# Altium integrated library Weidmueller_OMNIMATE_Signal.IntLib: 2550 symbols (part 38 of 45) (continued)
## 1886180000_Single (continued)
OMNIMATE Signal - series LSF; PartNumber: 1886180000; Manufacturer: Weidmueller; Short_text_for_material: LSF-SMT 7.62/02/135 3.5SN BK TU; Side_termination_characteristic: closed side; Mounting_onto_the_PCB: Reflow solder connection; Pitch_mm: 7,62 mm; Pitch_inch: 0,3 inch; No_of_poles: 2; Solder_pin_length_mm: 3,5 mm; Contact_material: Cu-Leg; Contact_surface: tinned; Insulating_material: LCP GF; UL_94_flammability_rating: V-0; Rated_voltage_for_surge_voltage_class_pollution_degree_II_2: 800 V; Rated_current_min_no_of_poles_TU_20_deg_C: 17,5 A; Solid_min_H05_07_V_U: 0,2 mm²; Solid_max_H05_07_V_U: 1,5 mm²; Rated_voltage_use_group_B_UL_1059: 300 V; Rated_current_use_group_B_UL_1059: 12 A; Wire_cross_section_AWG_min_UL_1059: AWG 24; Wire_cross_section_AWG_max_UL_1059: AWG 16; PackageReference: LSF_SMT_7_62_135_02; Colour: Black; Packaging: Tube; Qty: 46 PCS; Revision: V1; ComponentLink1Description: Manufacturer URL; ComponentLink1URL: http://www.weidmueller.com/; ComponentLink2Description: URL Link1; ComponentLink2URL: http://catalog.weidmueller.com/catalog/Start.do?localeId=en&ObjectID=1886180000
footprint LSF_SMT_7_62_135_02 (OMNIMATE Signal - Serie LSF  LSF-SMT 7.62/02/135 1.5)
part A pins: A1
part B pins: A2
1 alternate drawing of the same symbol

## 1886190000
designator E?
OMNIMATE Signal - series LSF; PartNumber: 1886190000; Manufacturer: Weidmueller; Short_text_for_material: LSF-SMT 7.62/03/135 3.5SN BK TU; Side_termination_characteristic: closed side; Mounting_onto_the_PCB: Reflow solder connection; Pitch_mm: 7,62 mm; Pitch_inch: 0,3 inch; No_of_poles: 3; Solder_pin_length_mm: 3,5 mm; Contact_material: Cu-Leg; Contact_surface: tinned; Insulating_material: LCP GF; UL_94_flammability_rating: V-0; Rated_voltage_for_surge_voltage_class_pollution_degree_II_2: 800 V; Rated_current_min_no_of_poles_TU_20_deg_C: 17,5 A; Solid_min_H05_07_V_U: 0,2 mm²; Solid_max_H05_07_V_U: 1,5 mm²; Rated_voltage_use_group_B_UL_1059: 300 V; Rated_current_use_group_B_UL_1059: 12 A; Wire_cross_section_AWG_min_UL_1059: AWG 24; Wire_cross_section_AWG_max_UL_1059: AWG 16; PackageReference: LSF_SMT_7_62_135_03; Colour: Black; Packaging: Tube; Qty: 28 PCS; Revision: V1; ComponentLink1Description: Manufacturer URL; ComponentLink1URL: http://www.weidmueller.com/; ComponentLink2Description: URL Link1; ComponentLink2URL: http://catalog.weidmueller.com/catalog/Start.do?localeId=en&ObjectID=1886190000
footprint LSF_SMT_7_62_135_03 (OMNIMATE Signal - Serie LSF  LSF-SMT 7.62/03/135 1.5)
pins: A1, A2, A3
1 alternate drawing of the same symbol

## 1886190000_Single
designator E?
OMNIMATE Signal - series LSF; PartNumber: 1886190000; Manufacturer: Weidmueller; Short_text_for_material: LSF-SMT 7.62/03/135 3.5SN BK TU; Side_termination_characteristic: closed side; Mounting_onto_the_PCB: Reflow solder connection; Pitch_mm: 7,62 mm; Pitch_inch: 0,3 inch; No_of_poles: 3; Solder_pin_length_mm: 3,5 mm; Contact_material: Cu-Leg; Contact_surface: tinned; Insulating_material: LCP GF; UL_94_flammability_rating: V-0; Rated_voltage_for_surge_voltage_class_pollution_degree_II_2: 800 V; Rated_current_min_no_of_poles_TU_20_deg_C: 17,5 A; Solid_min_H05_07_V_U: 0,2 mm²; Solid_max_H05_07_V_U: 1,5 mm²; Rated_voltage_use_group_B_UL_1059: 300 V; Rated_current_use_group_B_UL_1059: 12 A; Wire_cross_section_AWG_min_UL_1059: AWG 24; Wire_cross_section_AWG_max_UL_1059: AWG 16; PackageReference: LSF_SMT_7_62_135_03; Colour: Black; Packaging: Tube; Qty: 28 PCS; Revision: V1; ComponentLink1Description: Manufacturer URL; ComponentLink1URL: http://www.weidmueller.com/; ComponentLink2Description: URL Link1; ComponentLink2URL: http://catalog.weidmueller.com/catalog/Start.do?localeId=en&ObjectID=1886190000
footprint LSF_SMT_7_62_135_03 (OMNIMATE Signal - Serie LSF  LSF-SMT 7.62/03/135 1.5)
part A pins: A1
part B pins: A2
part C pins: A3
1 alternate drawing of the same symbol

## 1886200000
designator E?
OMNIMATE Signal - series LSF; PartNumber: 1886200000; Manufacturer: Weidmueller; Short_text_for_material: LSF-SMT 7.62/04/135 3.5SN BK TU; Side_termination_characteristic: closed side; Mounting_onto_the_PCB: Reflow solder connection; Pitch_mm: 7,62 mm; Pitch_inch: 0,3 inch; No_of_poles: 4; Solder_pin_length_mm: 3,5 mm; Contact_material: Cu-Leg; Contact_surface: tinned; Insulating_material: LCP GF; UL_94_flammability_rating: V-0; Rated_voltage_for_surge_voltage_class_pollution_degree_II_2: 800 V; Rated_current_min_no_of_poles_TU_20_deg_C: 17,5 A; Solid_min_H05_07_V_U: 0,2 mm²; Solid_max_H05_07_V_U: 1,5 mm²; Rated_voltage_use_group_B_UL_1059: 300 V; Rated_current_use_group_B_UL_1059: 12 A; Wire_cross_section_AWG_min_UL_1059: AWG 24; Wire_cross_section_AWG_max_UL_1059: AWG 16; PackageReference: LSF_SMT_7_62_135_04; Colour: Black; Packaging: Tube; Qty: 20 PCS; Revision: V1; ComponentLink1Description: Manufacturer URL; ComponentLink1URL: http://www.weidmueller.com/; ComponentLink2Description: URL Link1; ComponentLink2URL: http://catalog.weidmueller.com/catalog/Start.do?localeId=en&ObjectID=1886200000
footprint LSF_SMT_7_62_135_04 (OMNIMATE Signal - Serie LSF  LSF-SMT 7.62/04/135 1.5)
pins: A1, A2, A3, A4
1 alternate drawing of the same symbol

## 1886200000_Single
designator E?
OMNIMATE Signal - series LSF; PartNumber: 1886200000; Manufacturer: Weidmueller; Short_text_for_material: LSF-SMT 7.62/04/135 3.5SN BK TU; Side_termination_characteristic: closed side; Mounting_onto_the_PCB: Reflow solder connection; Pitch_mm: 7,62 mm; Pitch_inch: 0,3 inch; No_of_poles: 4; Solder_pin_length_mm: 3,5 mm; Contact_material: Cu-Leg; Contact_surface: tinned; Insulating_material: LCP GF; UL_94_flammability_rating: V-0; Rated_voltage_for_surge_voltage_class_pollution_degree_II_2: 800 V; Rated_current_min_no_of_poles_TU_20_deg_C: 17,5 A; Solid_min_H05_07_V_U: 0,2 mm²; Solid_max_H05_07_V_U: 1,5 mm²; Rated_voltage_use_group_B_UL_1059: 300 V; Rated_current_use_group_B_UL_1059: 12 A; Wire_cross_section_AWG_min_UL_1059: AWG 24; Wire_cross_section_AWG_max_UL_1059: AWG 16; PackageReference: LSF_SMT_7_62_135_04; Colour: Black; Packaging: Tube; Qty: 20 PCS; Revision: V1; ComponentLink1Description: Manufacturer URL; ComponentLink1URL: http://www.weidmueller.com/; ComponentLink2Description: URL Link1; ComponentLink2URL: http://catalog.weidmueller.com/catalog/Start.do?localeId=en&ObjectID=1886200000
footprint LSF_SMT_7_62_135_04 (OMNIMATE Signal - Serie LSF  LSF-SMT 7.62/04/135 1.5)
part A pins: A1
part B pins: A2
part C pins: A3
part D pins: A4
1 alternate drawing of the same symbol

## 1886240000
designator E?
OMNIMATE Signal - series LSF; PartNumber: 1886240000; Manufacturer: Weidmueller; Short_text_for_material: LSF-SMT 7.62/08/135 3.5SN BK TU; Side_termination_characteristic: closed side; Mounting_onto_the_PCB: Reflow solder connection; Pitch_mm: 7,62 mm; Pitch_inch: 0,3 inch; No_of_poles: 8; Solder_pin_length_mm: 3,5 mm; Contact_material: Cu-Leg; Contact_surface: tinned; Insulating_material: LCP GF; UL_94_flammability_rating: V-0; Rated_voltage_for_surge_voltage_class_pollution_degree_II_2: 800 V; Rated_current_min_no_of_poles_TU_20_deg_C: 17,5 A; Solid_min_H05_07_V_U: 0,2 mm²; Solid_max_H05_07_V_U: 1,5 mm²; Rated_voltage_use_group_B_UL_1059: 300 V; Rated_current_use_group_B_UL_1059: 12 A; Wire_cross_section_AWG_min_UL_1059: AWG 24; Wire_cross_section_AWG_max_UL_1059: AWG 16; PackageReference: LSF_SMT_7_62_135_08; Colour: Black; Packaging: Tube; Qty: 9 PCS; Revision: V1; ComponentLink1Description: Manufacturer URL; ComponentLink1URL: http://www.weidmueller.com/; ComponentLink2Description: URL Link1; ComponentLink2URL: http://catalog.weidmueller.com/catalog/Start.do?localeId=en&ObjectID=1886240000
footprint LSF_SMT_7_62_135_08 (OMNIMATE Signal - Serie LSF  LSF-SMT 7.62/08/135 1.5)
pins: A1, A2, A3, A4, A5, A6, A7, A8
1 alternate drawing of the same symbol

## 1886240000_Single
designator E?
OMNIMATE Signal - series LSF; PartNumber: 1886240000; Manufacturer: Weidmueller; Short_text_for_material: LSF-SMT 7.62/08/135 3.5SN BK TU; Side_termination_characteristic: closed side; Mounting_onto_the_PCB: Reflow solder connection; Pitch_mm: 7,62 mm; Pitch_inch: 0,3 inch; No_of_poles: 8; Solder_pin_length_mm: 3,5 mm; Contact_material: Cu-Leg; Contact_surface: tinned; Insulating_material: LCP GF; UL_94_flammability_rating: V-0; Rated_voltage_for_surge_voltage_class_pollution_degree_II_2: 800 V; Rated_current_min_no_of_poles_TU_20_deg_C: 17,5 A; Solid_min_H05_07_V_U: 0,2 mm²; Solid_max_H05_07_V_U: 1,5 mm²; Rated_voltage_use_group_B_UL_1059: 300 V; Rated_current_use_group_B_UL_1059: 12 A; Wire_cross_section_AWG_min_UL_1059: AWG 24; Wire_cross_section_AWG_max_UL_1059: AWG 16; PackageReference: LSF_SMT_7_62_135_08; Colour: Black; Packaging: Tube; Qty: 9 PCS; Revision: V1; ComponentLink1Description: Manufacturer URL; ComponentLink1URL: http://www.weidmueller.com/; ComponentLink2Description: URL Link1; ComponentLink2URL: http://catalog.weidmueller.com/catalog/Start.do?localeId=en&ObjectID=1886240000
footprint LSF_SMT_7_62_135_08 (OMNIMATE Signal - Serie LSF  LSF-SMT 7.62/08/135 1.5)
part A pins: A1
part B pins: A2
part C pins: A3
part D pins: A4
part E pins: A5
part F pins: A6
part G pins: A7
part H pins: A8
1 alternate drawing of the same symbol

## 1887110000
designator E?
OMNIMATE Signal - series LSF; PartNumber: 1887110000; Manufacturer: Weidmueller; Short_text_for_material: LSF-SMT 7.62/02/135 1.5SN BK RL; Side_termination_characteristic: closed side; Mounting_onto_the_PCB: Reflow solder connection; Pitch_mm: 7,62 mm; Pitch_inch: 0,3 inch; No_of_poles: 2; Solder_pin_length_mm: 1,5 mm; Contact_material: Cu-Leg; Contact_surface: tinned; Insulating_material: LCP GF; UL_94_flammability_rating: V-0; Rated_voltage_for_surge_voltage_class_pollution_degree_II_2: 800 V; Rated_current_min_no_of_poles_TU_20_deg_C: 17,5 A; Solid_min_H05_07_V_U: 0,2 mm²; Solid_max_H05_07_V_U: 1,5 mm²; Rated_voltage_use_group_B_UL_1059: 300 V; Rated_current_use_group_B_UL_1059: 12 A; Wire_cross_section_AWG_min_UL_1059: AWG 24; Wire_cross_section_AWG_max_UL_1059: AWG 16; PackageReference: LSF_SMT_7_62_135_02; Colour: Black; Packaging: Tape; Qty: 190 PCS; Revision: V1; ComponentLink1Description: Manufacturer URL; ComponentLink1URL: http://www.weidmueller.com/; ComponentLink2Description: URL Link1; ComponentLink2URL: http://catalog.weidmueller.com/catalog/Start.do?localeId=en&ObjectID=1887110000
footprint LSF_SMT_7_62_135_02 (OMNIMATE Signal - Serie LSF  LSF-SMT 7.62/02/135 1.5)
pins: A1, A2
1 alternate drawing of the same symbol

## 1887110000_Single
designator E?
OMNIMATE Signal - series LSF; PartNumber: 1887110000; Manufacturer: Weidmueller; Short_text_for_material: LSF-SMT 7.62/02/135 1.5SN BK RL; Side_termination_characteristic: closed side; Mounting_onto_the_PCB: Reflow solder connection; Pitch_mm: 7,62 mm; Pitch_inch: 0,3 inch; No_of_poles: 2; Solder_pin_length_mm: 1,5 mm; Contact_material: Cu-Leg; Contact_surface: tinned; Insulating_material: LCP GF; UL_94_flammability_rating: V-0; Rated_voltage_for_surge_voltage_class_pollution_degree_II_2: 800 V; Rated_current_min_no_of_poles_TU_20_deg_C: 17,5 A; Solid_min_H05_07_V_U: 0,2 mm²; Solid_max_H05_07_V_U: 1,5 mm²; Rated_voltage_use_group_B_UL_1059: 300 V; Rated_current_use_group_B_UL_1059: 12 A; Wire_cross_section_AWG_min_UL_1059: AWG 24; Wire_cross_section_AWG_max_UL_1059: AWG 16; PackageReference: LSF_SMT_7_62_135_02; Colour: Black; Packaging: Tape; Qty: 190 PCS; Revision: V1; ComponentLink1Description: Manufacturer URL; ComponentLink1URL: http://www.weidmueller.com/; ComponentLink2Description: URL Link1; ComponentLink2URL: http://catalog.weidmueller.com/catalog/Start.do?localeId=en&ObjectID=1887110000
footprint LSF_SMT_7_62_135_02 (OMNIMATE Signal - Serie LSF  LSF-SMT 7.62/02/135 1.5)
part A pins: A1
part B pins: A2
1 alternate drawing of the same symbol

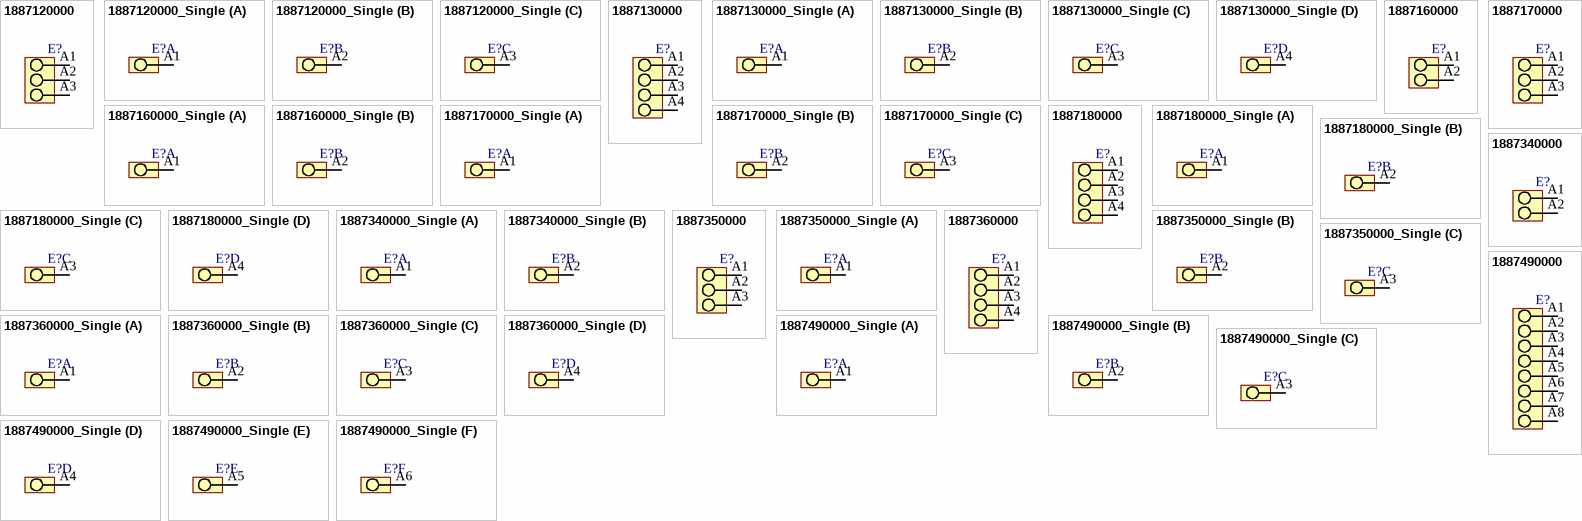
[diagram p179: symbols 1887120000 to 1887490000_Single]

## 1887120000
designator E?
OMNIMATE Signal - series LSF; PartNumber: 1887120000; Manufacturer: Weidmueller; Short_text_for_material: LSF-SMT 7.62/03/135 1.5SN BK RL; Side_termination_characteristic: closed side; Mounting_onto_the_PCB: Reflow solder connection; Pitch_mm: 7,62 mm; Pitch_inch: 0,3 inch; No_of_poles: 3; Solder_pin_length_mm: 1,5 mm; Contact_material: Cu-Leg; Contact_surface: tinned; Insulating_material: LCP GF; UL_94_flammability_rating: V-0; Rated_voltage_for_surge_voltage_class_pollution_degree_II_2: 800 V; Rated_current_min_no_of_poles_TU_20_deg_C: 17,5 A; Solid_min_H05_07_V_U: 0,2 mm²; Solid_max_H05_07_V_U: 1,5 mm²; Rated_voltage_use_group_B_UL_1059: 300 V; Rated_current_use_group_B_UL_1059: 12 A; Wire_cross_section_AWG_min_UL_1059: AWG 24; Wire_cross_section_AWG_max_UL_1059: AWG 16; PackageReference: LSF_SMT_7_62_135_03; Colour: Black; Packaging: Tape; Qty: 190 PCS; Revision: V1; ComponentLink1Description: Manufacturer URL; ComponentLink1URL: http://www.weidmueller.com/; ComponentLink2Description: URL Link1; ComponentLink2URL: http://catalog.weidmueller.com/catalog/Start.do?localeId=en&ObjectID=1887120000
footprint LSF_SMT_7_62_135_03 (OMNIMATE Signal - Serie LSF  LSF-SMT 7.62/03/135 1.5)
pins: A1, A2, A3
1 alternate drawing of the same symbol

## 1887120000_Single
designator E?
OMNIMATE Signal - series LSF; PartNumber: 1887120000; Manufacturer: Weidmueller; Short_text_for_material: LSF-SMT 7.62/03/135 1.5SN BK RL; Side_termination_characteristic: closed side; Mounting_onto_the_PCB: Reflow solder connection; Pitch_mm: 7,62 mm; Pitch_inch: 0,3 inch; No_of_poles: 3; Solder_pin_length_mm: 1,5 mm; Contact_material: Cu-Leg; Contact_surface: tinned; Insulating_material: LCP GF; UL_94_flammability_rating: V-0; Rated_voltage_for_surge_voltage_class_pollution_degree_II_2: 800 V; Rated_current_min_no_of_poles_TU_20_deg_C: 17,5 A; Solid_min_H05_07_V_U: 0,2 mm²; Solid_max_H05_07_V_U: 1,5 mm²; Rated_voltage_use_group_B_UL_1059: 300 V; Rated_current_use_group_B_UL_1059: 12 A; Wire_cross_section_AWG_min_UL_1059: AWG 24; Wire_cross_section_AWG_max_UL_1059: AWG 16; PackageReference: LSF_SMT_7_62_135_03; Colour: Black; Packaging: Tape; Qty: 190 PCS; Revision: V1; ComponentLink1Description: Manufacturer URL; ComponentLink1URL: http://www.weidmueller.com/; ComponentLink2Description: URL Link1; ComponentLink2URL: http://catalog.weidmueller.com/catalog/Start.do?localeId=en&ObjectID=1887120000
footprint LSF_SMT_7_62_135_03 (OMNIMATE Signal - Serie LSF  LSF-SMT 7.62/03/135 1.5)
part A pins: A1
part B pins: A2
part C pins: A3
1 alternate drawing of the same symbol

## 1887130000
designator E?
OMNIMATE Signal - series LSF; PartNumber: 1887130000; Manufacturer: Weidmueller; Short_text_for_material: LSF-SMT 7.62/04/135 1.5SN BK RL; Side_termination_characteristic: closed side; Mounting_onto_the_PCB: Reflow solder connection; Pitch_mm: 7,62 mm; Pitch_inch: 0,3 inch; No_of_poles: 4; Solder_pin_length_mm: 1,5 mm; Contact_material: Cu-Leg; Contact_surface: tinned; Insulating_material: LCP GF; UL_94_flammability_rating: V-0; Rated_voltage_for_surge_voltage_class_pollution_degree_II_2: 800 V; Rated_current_min_no_of_poles_TU_20_deg_C: 17,5 A; Solid_min_H05_07_V_U: 0,2 mm²; Solid_max_H05_07_V_U: 1,5 mm²; Rated_voltage_use_group_B_UL_1059: 300 V; Rated_current_use_group_B_UL_1059: 12 A; Wire_cross_section_AWG_min_UL_1059: AWG 24; Wire_cross_section_AWG_max_UL_1059: AWG 16; PackageReference: LSF_SMT_7_62_135_04; Colour: Black; Packaging: Tape; Qty: 190 PCS; Revision: V1; ComponentLink1Description: Manufacturer URL; ComponentLink1URL: http://www.weidmueller.com/; ComponentLink2Description: URL Link1; ComponentLink2URL: http://catalog.weidmueller.com/catalog/Start.do?localeId=en&ObjectID=1887130000
footprint LSF_SMT_7_62_135_04 (OMNIMATE Signal - Serie LSF  LSF-SMT 7.62/04/135 1.5)
pins: A1, A2, A3, A4
1 alternate drawing of the same symbol

## 1887130000_Single
designator E?
OMNIMATE Signal - series LSF; PartNumber: 1887130000; Manufacturer: Weidmueller; Short_text_for_material: LSF-SMT 7.62/04/135 1.5SN BK RL; Side_termination_characteristic: closed side; Mounting_onto_the_PCB: Reflow solder connection; Pitch_mm: 7,62 mm; Pitch_inch: 0,3 inch; No_of_poles: 4; Solder_pin_length_mm: 1,5 mm; Contact_material: Cu-Leg; Contact_surface: tinned; Insulating_material: LCP GF; UL_94_flammability_rating: V-0; Rated_voltage_for_surge_voltage_class_pollution_degree_II_2: 800 V; Rated_current_min_no_of_poles_TU_20_deg_C: 17,5 A; Solid_min_H05_07_V_U: 0,2 mm²; Solid_max_H05_07_V_U: 1,5 mm²; Rated_voltage_use_group_B_UL_1059: 300 V; Rated_current_use_group_B_UL_1059: 12 A; Wire_cross_section_AWG_min_UL_1059: AWG 24; Wire_cross_section_AWG_max_UL_1059: AWG 16; PackageReference: LSF_SMT_7_62_135_04; Colour: Black; Packaging: Tape; Qty: 190 PCS; Revision: V1; ComponentLink1Description: Manufacturer URL; ComponentLink1URL: http://www.weidmueller.com/; ComponentLink2Description: URL Link1; ComponentLink2URL: http://catalog.weidmueller.com/catalog/Start.do?localeId=en&ObjectID=1887130000
footprint LSF_SMT_7_62_135_04 (OMNIMATE Signal - Serie LSF  LSF-SMT 7.62/04/135 1.5)
part A pins: A1
part B pins: A2
part C pins: A3
part D pins: A4
1 alternate drawing of the same symbol

## 1887160000
designator E?
OMNIMATE Signal - series LSF; PartNumber: 1887160000; Manufacturer: Weidmueller; Short_text_for_material: LSF-SMT 7.62/02/135 3.5SN BK RL; Side_termination_characteristic: closed side; Mounting_onto_the_PCB: Reflow solder connection; Pitch_mm: 7,62 mm; Pitch_inch: 0,3 inch; No_of_poles: 2; Solder_pin_length_mm: 3,5 mm; Contact_material: Cu-Leg; Contact_surface: tinned; Insulating_material: LCP GF; UL_94_flammability_rating: V-0; Rated_voltage_for_surge_voltage_class_pollution_degree_II_2: 800 V; Rated_current_min_no_of_poles_TU_20_deg_C: 17,5 A; Solid_min_H05_07_V_U: 0,2 mm²; Solid_max_H05_07_V_U: 1,5 mm²; Rated_voltage_use_group_B_UL_1059: 300 V; Rated_current_use_group_B_UL_1059: 12 A; Wire_cross_section_AWG_min_UL_1059: AWG 24; Wire_cross_section_AWG_max_UL_1059: AWG 16; PackageReference: LSF_SMT_7_62_135_02; Colour: Black; Packaging: Tape; Qty: 190 PCS; Revision: V1; ComponentLink1Description: Manufacturer URL; ComponentLink1URL: http://www.weidmueller.com/; ComponentLink2Description: URL Link1; ComponentLink2URL: http://catalog.weidmueller.com/catalog/Start.do?localeId=en&ObjectID=1887160000
footprint LSF_SMT_7_62_135_02 (OMNIMATE Signal - Serie LSF  LSF-SMT 7.62/02/135 1.5)
pins: A1, A2
1 alternate drawing of the same symbol

## 1887160000_Single
designator E?
OMNIMATE Signal - series LSF; PartNumber: 1887160000; Manufacturer: Weidmueller; Short_text_for_material: LSF-SMT 7.62/02/135 3.5SN BK RL; Side_termination_characteristic: closed side; Mounting_onto_the_PCB: Reflow solder connection; Pitch_mm: 7,62 mm; Pitch_inch: 0,3 inch; No_of_poles: 2; Solder_pin_length_mm: 3,5 mm; Contact_material: Cu-Leg; Contact_surface: tinned; Insulating_material: LCP GF; UL_94_flammability_rating: V-0; Rated_voltage_for_surge_voltage_class_pollution_degree_II_2: 800 V; Rated_current_min_no_of_poles_TU_20_deg_C: 17,5 A; Solid_min_H05_07_V_U: 0,2 mm²; Solid_max_H05_07_V_U: 1,5 mm²; Rated_voltage_use_group_B_UL_1059: 300 V; Rated_current_use_group_B_UL_1059: 12 A; Wire_cross_section_AWG_min_UL_1059: AWG 24; Wire_cross_section_AWG_max_UL_1059: AWG 16; PackageReference: LSF_SMT_7_62_135_02; Colour: Black; Packaging: Tape; Qty: 190 PCS; Revision: V1; ComponentLink1Description: Manufacturer URL; ComponentLink1URL: http://www.weidmueller.com/; ComponentLink2Description: URL Link1; ComponentLink2URL: http://catalog.weidmueller.com/catalog/Start.do?localeId=en&ObjectID=1887160000
footprint LSF_SMT_7_62_135_02 (OMNIMATE Signal - Serie LSF  LSF-SMT 7.62/02/135 1.5)
part A pins: A1
part B pins: A2
1 alternate drawing of the same symbol

## 1887170000
designator E?
OMNIMATE Signal - series LSF; PartNumber: 1887170000; Manufacturer: Weidmueller; Short_text_for_material: LSF-SMT 7.62/03/135 3.5SN BK RL; Side_termination_characteristic: closed side; Mounting_onto_the_PCB: Reflow solder connection; Pitch_mm: 7,62 mm; Pitch_inch: 0,3 inch; No_of_poles: 3; Solder_pin_length_mm: 3,5 mm; Contact_material: Cu-Leg; Contact_surface: tinned; Insulating_material: LCP GF; UL_94_flammability_rating: V-0; Rated_voltage_for_surge_voltage_class_pollution_degree_II_2: 800 V; Rated_current_min_no_of_poles_TU_20_deg_C: 17,5 A; Solid_min_H05_07_V_U: 0,2 mm²; Solid_max_H05_07_V_U: 1,5 mm²; Rated_voltage_use_group_B_UL_1059: 300 V; Rated_current_use_group_B_UL_1059: 12 A; Wire_cross_section_AWG_min_UL_1059: AWG 24; Wire_cross_section_AWG_max_UL_1059: AWG 16; PackageReference: LSF_SMT_7_62_135_03; Colour: Black; Packaging: Tape; Qty: 190 PCS; Revision: V1; ComponentLink1Description: Manufacturer URL; ComponentLink1URL: http://www.weidmueller.com/; ComponentLink2Description: URL Link1; ComponentLink2URL: http://catalog.weidmueller.com/catalog/Start.do?localeId=en&ObjectID=1887170000
footprint LSF_SMT_7_62_135_03 (OMNIMATE Signal - Serie LSF  LSF-SMT 7.62/03/135 1.5)
pins: A1, A2, A3
1 alternate drawing of the same symbol

## 1887170000_Single
designator E?
OMNIMATE Signal - series LSF; PartNumber: 1887170000; Manufacturer: Weidmueller; Short_text_for_material: LSF-SMT 7.62/03/135 3.5SN BK RL; Side_termination_characteristic: closed side; Mounting_onto_the_PCB: Reflow solder connection; Pitch_mm: 7,62 mm; Pitch_inch: 0,3 inch; No_of_poles: 3; Solder_pin_length_mm: 3,5 mm; Contact_material: Cu-Leg; Contact_surface: tinned; Insulating_material: LCP GF; UL_94_flammability_rating: V-0; Rated_voltage_for_surge_voltage_class_pollution_degree_II_2: 800 V; Rated_current_min_no_of_poles_TU_20_deg_C: 17,5 A; Solid_min_H05_07_V_U: 0,2 mm²; Solid_max_H05_07_V_U: 1,5 mm²; Rated_voltage_use_group_B_UL_1059: 300 V; Rated_current_use_group_B_UL_1059: 12 A; Wire_cross_section_AWG_min_UL_1059: AWG 24; Wire_cross_section_AWG_max_UL_1059: AWG 16; PackageReference: LSF_SMT_7_62_135_03; Colour: Black; Packaging: Tape; Qty: 190 PCS; Revision: V1; ComponentLink1Description: Manufacturer URL; ComponentLink1URL: http://www.weidmueller.com/; ComponentLink2Description: URL Link1; ComponentLink2URL: http://catalog.weidmueller.com/catalog/Start.do?localeId=en&ObjectID=1887170000
footprint LSF_SMT_7_62_135_03 (OMNIMATE Signal - Serie LSF  LSF-SMT 7.62/03/135 1.5)
part A pins: A1
part B pins: A2
part C pins: A3
1 alternate drawing of the same symbol

## 1887180000
designator E?
OMNIMATE Signal - series LSF; PartNumber: 1887180000; Manufacturer: Weidmueller; Short_text_for_material: LSF-SMT 7.62/04/135 3.5SN BK RL; Side_termination_characteristic: closed side; Mounting_onto_the_PCB: Reflow solder connection; Pitch_mm: 7,62 mm; Pitch_inch: 0,3 inch; No_of_poles: 4; Solder_pin_length_mm: 3,5 mm; Contact_material: Cu-Leg; Contact_surface: tinned; Insulating_material: LCP GF; UL_94_flammability_rating: V-0; Rated_voltage_for_surge_voltage_class_pollution_degree_II_2: 800 V; Rated_current_min_no_of_poles_TU_20_deg_C: 17,5 A; Solid_min_H05_07_V_U: 0,2 mm²; Solid_max_H05_07_V_U: 1,5 mm²; Rated_voltage_use_group_B_UL_1059: 300 V; Rated_current_use_group_B_UL_1059: 12 A; Wire_cross_section_AWG_min_UL_1059: AWG 24; Wire_cross_section_AWG_max_UL_1059: AWG 16; PackageReference: LSF_SMT_7_62_135_04; Colour: Black; Packaging: Tape; Qty: 190 PCS; Revision: V1; ComponentLink1Description: Manufacturer URL; ComponentLink1URL: http://www.weidmueller.com/; ComponentLink2Description: URL Link1; ComponentLink2URL: http://catalog.weidmueller.com/catalog/Start.do?localeId=en&ObjectID=1887180000
footprint LSF_SMT_7_62_135_04 (OMNIMATE Signal - Serie LSF  LSF-SMT 7.62/04/135 1.5)
pins: A1, A2, A3, A4
1 alternate drawing of the same symbol

## 1887180000_Single
designator E?
OMNIMATE Signal - series LSF; PartNumber: 1887180000; Manufacturer: Weidmueller; Short_text_for_material: LSF-SMT 7.62/04/135 3.5SN BK RL; Side_termination_characteristic: closed side; Mounting_onto_the_PCB: Reflow solder connection; Pitch_mm: 7,62 mm; Pitch_inch: 0,3 inch; No_of_poles: 4; Solder_pin_length_mm: 3,5 mm; Contact_material: Cu-Leg; Contact_surface: tinned; Insulating_material: LCP GF; UL_94_flammability_rating: V-0; Rated_voltage_for_surge_voltage_class_pollution_degree_II_2: 800 V; Rated_current_min_no_of_poles_TU_20_deg_C: 17,5 A; Solid_min_H05_07_V_U: 0,2 mm²; Solid_max_H05_07_V_U: 1,5 mm²; Rated_voltage_use_group_B_UL_1059: 300 V; Rated_current_use_group_B_UL_1059: 12 A; Wire_cross_section_AWG_min_UL_1059: AWG 24; Wire_cross_section_AWG_max_UL_1059: AWG 16; PackageReference: LSF_SMT_7_62_135_04; Colour: Black; Packaging: Tape; Qty: 190 PCS; Revision: V1; ComponentLink1Description: Manufacturer URL; ComponentLink1URL: http://www.weidmueller.com/; ComponentLink2Description: URL Link1; ComponentLink2URL: http://catalog.weidmueller.com/catalog/Start.do?localeId=en&ObjectID=1887180000
footprint LSF_SMT_7_62_135_04 (OMNIMATE Signal - Serie LSF  LSF-SMT 7.62/04/135 1.5)
part A pins: A1
part B pins: A2
part C pins: A3
part D pins: A4
1 alternate drawing of the same symbol

## 1887340000
designator E?
OMNIMATE Signal - series LSF; PartNumber: 1887340000; Manufacturer: Weidmueller; Short_text_for_material: LSF-SMT 3.50/02/135 3.5SN BK RL; Side_termination_characteristic: closed side; Mounting_onto_the_PCB: Reflow solder connection; Pitch_mm: 3,5 mm; Pitch_inch: 0,138 inch; No_of_poles: 2; Contact_material: Cu-Leg; Contact_surface: tinned; Insulating_material: LCP GF; UL_94_flammability_rating: V-0; Rated_voltage_for_surge_voltage_class_pollution_degree_II_2: 320 V; Rated_current_min_no_of_poles_TU_20_deg_C: 17,5 A; Solid_min_H05_07_V_U: 0,2 mm²; Solid_max_H05_07_V_U: 1,5 mm²; Rated_voltage_use_group_B_UL_1059: 300 V; Rated_current_use_group_B_UL_1059: 12 A; Wire_cross_section_AWG_min_UL_1059: AWG 24; Wire_cross_section_AWG_max_UL_1059: AWG 16; PackageReference: LSF_SMT_3_5_135_02; Colour: Black; Solder_pin_length_mm: 3,5 mm; Packaging: Tape; Qty: 190 PCS; Revision: V1; ComponentLink1Description: Manufacturer URL; ComponentLink1URL: http://www.weidmueller.com/; ComponentLink2Description: URL Link1; ComponentLink2URL: http://catalog.weidmueller.com/catalog/Start.do?localeId=en&ObjectID=1887340000
footprint LSF_SMT_3_5_135_02 (OMNIMATE Signal - Serie LSF  LSF-SMT 3.50/02/135 1.5)
pins: A1, A2
1 alternate drawing of the same symbol

## 1887340000_Single
designator E?
OMNIMATE Signal - series LSF; PartNumber: 1887340000; Manufacturer: Weidmueller; Short_text_for_material: LSF-SMT 3.50/02/135 3.5SN BK RL; Side_termination_characteristic: closed side; Mounting_onto_the_PCB: Reflow solder connection; Pitch_mm: 3,5 mm; Pitch_inch: 0,138 inch; No_of_poles: 2; Contact_material: Cu-Leg; Contact_surface: tinned; Insulating_material: LCP GF; UL_94_flammability_rating: V-0; Rated_voltage_for_surge_voltage_class_pollution_degree_II_2: 320 V; Rated_current_min_no_of_poles_TU_20_deg_C: 17,5 A; Solid_min_H05_07_V_U: 0,2 mm²; Solid_max_H05_07_V_U: 1,5 mm²; Rated_voltage_use_group_B_UL_1059: 300 V; Rated_current_use_group_B_UL_1059: 12 A; Wire_cross_section_AWG_min_UL_1059: AWG 24; Wire_cross_section_AWG_max_UL_1059: AWG 16; PackageReference: LSF_SMT_3_5_135_02; Colour: Black; Solder_pin_length_mm: 3,5 mm; Packaging: Tape; Qty: 190 PCS; Revision: V1; ComponentLink1Description: Manufacturer URL; ComponentLink1URL: http://www.weidmueller.com/; ComponentLink2Description: URL Link1; ComponentLink2URL: http://catalog.weidmueller.com/catalog/Start.do?localeId=en&ObjectID=1887340000
footprint LSF_SMT_3_5_135_02 (OMNIMATE Signal - Serie LSF  LSF-SMT 3.50/02/135 1.5)
part A pins: A1
part B pins: A2
1 alternate drawing of the same symbol

## 1887350000
designator E?
OMNIMATE Signal - series LSF; PartNumber: 1887350000; Manufacturer: Weidmueller; Short_text_for_material: LSF-SMT 3.50/03/135 3.5SN BK RL; Side_termination_characteristic: closed side; Mounting_onto_the_PCB: Reflow solder connection; Pitch_mm: 3,5 mm; Pitch_inch: 0,138 inch; No_of_poles: 3; Contact_material: Cu-Leg; Contact_surface: tinned; Insulating_material: LCP GF; UL_94_flammability_rating: V-0; Rated_voltage_for_surge_voltage_class_pollution_degree_II_2: 320 V; Rated_current_min_no_of_poles_TU_20_deg_C: 17,5 A; Solid_min_H05_07_V_U: 0,2 mm²; Solid_max_H05_07_V_U: 1,5 mm²; Rated_voltage_use_group_B_UL_1059: 300 V; Rated_current_use_group_B_UL_1059: 12 A; Wire_cross_section_AWG_min_UL_1059: AWG 24; Wire_cross_section_AWG_max_UL_1059: AWG 16; PackageReference: LSF_SMT_3_5_135_03; Colour: Black; Solder_pin_length_mm: 3,5 mm; Packaging: Tape; Qty: 190 PCS; Revision: V1; ComponentLink1Description: Manufacturer URL; ComponentLink1URL: http://www.weidmueller.com/; ComponentLink2Description: URL Link1; ComponentLink2URL: http://catalog.weidmueller.com/catalog/Start.do?localeId=en&ObjectID=1887350000
footprint LSF_SMT_3_5_135_03 (OMNIMATE Signal - Serie LSF  LSF-SMT 3.50/03/135 1.5)
pins: A1, A2, A3
1 alternate drawing of the same symbol

## 1887350000_Single
designator E?
OMNIMATE Signal - series LSF; PartNumber: 1887350000; Manufacturer: Weidmueller; Short_text_for_material: LSF-SMT 3.50/03/135 3.5SN BK RL; Side_termination_characteristic: closed side; Mounting_onto_the_PCB: Reflow solder connection; Pitch_mm: 3,5 mm; Pitch_inch: 0,138 inch; No_of_poles: 3; Contact_material: Cu-Leg; Contact_surface: tinned; Insulating_material: LCP GF; UL_94_flammability_rating: V-0; Rated_voltage_for_surge_voltage_class_pollution_degree_II_2: 320 V; Rated_current_min_no_of_poles_TU_20_deg_C: 17,5 A; Solid_min_H05_07_V_U: 0,2 mm²; Solid_max_H05_07_V_U: 1,5 mm²; Rated_voltage_use_group_B_UL_1059: 300 V; Rated_current_use_group_B_UL_1059: 12 A; Wire_cross_section_AWG_min_UL_1059: AWG 24; Wire_cross_section_AWG_max_UL_1059: AWG 16; PackageReference: LSF_SMT_3_5_135_03; Colour: Black; Solder_pin_length_mm: 3,5 mm; Packaging: Tape; Qty: 190 PCS; Revision: V1; ComponentLink1Description: Manufacturer URL; ComponentLink1URL: http://www.weidmueller.com/; ComponentLink2Description: URL Link1; ComponentLink2URL: http://catalog.weidmueller.com/catalog/Start.do?localeId=en&ObjectID=1887350000
footprint LSF_SMT_3_5_135_03 (OMNIMATE Signal - Serie LSF  LSF-SMT 3.50/03/135 1.5)
part A pins: A1
part B pins: A2
part C pins: A3
1 alternate drawing of the same symbol

## 1887360000
designator E?
OMNIMATE Signal - series LSF; PartNumber: 1887360000; Manufacturer: Weidmueller; Short_text_for_material: LSF-SMT 3.50/04/135 3.5SN BK RL; Side_termination_characteristic: closed side; Mounting_onto_the_PCB: Reflow solder connection; Pitch_mm: 3,5 mm; Pitch_inch: 0,138 inch; No_of_poles: 4; Contact_material: Cu-Leg; Contact_surface: tinned; Insulating_material: LCP GF; UL_94_flammability_rating: V-0; Rated_voltage_for_surge_voltage_class_pollution_degree_II_2: 320 V; Rated_current_min_no_of_poles_TU_20_deg_C: 17,5 A; Solid_min_H05_07_V_U: 0,2 mm²; Solid_max_H05_07_V_U: 1,5 mm²; Rated_voltage_use_group_B_UL_1059: 300 V; Rated_current_use_group_B_UL_1059: 12 A; Wire_cross_section_AWG_min_UL_1059: AWG 24; Wire_cross_section_AWG_max_UL_1059: AWG 16; PackageReference: LSF_SMT_3_5_135_04; Colour: Black; Solder_pin_length_mm: 3,5 mm; Packaging: Tape; Qty: 190 PCS; Revision: V1; ComponentLink1Description: Manufacturer URL; ComponentLink1URL: http://www.weidmueller.com/; ComponentLink2Description: URL Link1; ComponentLink2URL: http://catalog.weidmueller.com/catalog/Start.do?localeId=en&ObjectID=1887360000
footprint LSF_SMT_3_5_135_04 (OMNIMATE Signal - Serie LSF  LSF-SMT 3.50/04/135 1.5)
pins: A1, A2, A3, A4
1 alternate drawing of the same symbol

## 1887360000_Single
designator E?
OMNIMATE Signal - series LSF; PartNumber: 1887360000; Manufacturer: Weidmueller; Short_text_for_material: LSF-SMT 3.50/04/135 3.5SN BK RL; Side_termination_characteristic: closed side; Mounting_onto_the_PCB: Reflow solder connection; Pitch_mm: 3,5 mm; Pitch_inch: 0,138 inch; No_of_poles: 4; Contact_material: Cu-Leg; Contact_surface: tinned; Insulating_material: LCP GF; UL_94_flammability_rating: V-0; Rated_voltage_for_surge_voltage_class_pollution_degree_II_2: 320 V; Rated_current_min_no_of_poles_TU_20_deg_C: 17,5 A; Solid_min_H05_07_V_U: 0,2 mm²; Solid_max_H05_07_V_U: 1,5 mm²; Rated_voltage_use_group_B_UL_1059: 300 V; Rated_current_use_group_B_UL_1059: 12 A; Wire_cross_section_AWG_min_UL_1059: AWG 24; Wire_cross_section_AWG_max_UL_1059: AWG 16; PackageReference: LSF_SMT_3_5_135_04; Colour: Black; Solder_pin_length_mm: 3,5 mm; Packaging: Tape; Qty: 190 PCS; Revision: V1; ComponentLink1Description: Manufacturer URL; ComponentLink1URL: http://www.weidmueller.com/; ComponentLink2Description: URL Link1; ComponentLink2URL: http://catalog.weidmueller.com/catalog/Start.do?localeId=en&ObjectID=1887360000
footprint LSF_SMT_3_5_135_04 (OMNIMATE Signal - Serie LSF  LSF-SMT 3.50/04/135 1.5)
part A pins: A1
part B pins: A2
part C pins: A3
part D pins: A4
1 alternate drawing of the same symbol

## 1887490000
designator E?
OMNIMATE Signal - series LSF; PartNumber: 1887490000; Manufacturer: Weidmueller; Short_text_for_material: LSF-SMT 3.50/08/135 3.5SN BK RL; Side_termination_characteristic: closed side; Mounting_onto_the_PCB: Reflow solder connection; Pitch_mm: 3,5 mm; Pitch_inch: 0,138 inch; No_of_poles: 8; Contact_material: Cu-Leg; Contact_surface: tinned; Insulating_material: LCP GF; UL_94_flammability_rating: V-0; Rated_voltage_for_surge_voltage_class_pollution_degree_II_2: 320 V; Rated_current_min_no_of_poles_TU_20_deg_C: 17,5 A; Solid_min_H05_07_V_U: 0,2 mm²; Solid_max_H05_07_V_U: 1,5 mm²; Rated_voltage_use_group_B_UL_1059: 300 V; Rated_current_use_group_B_UL_1059: 12 A; Wire_cross_section_AWG_min_UL_1059: AWG 24; Wire_cross_section_AWG_max_UL_1059: AWG 16; PackageReference: LSF_SMT_3_5_135_08; Colour: Black; Solder_pin_length_mm: 3,5 mm; Packaging: Tape; Qty: 190 PCS; Revision: V1; ComponentLink1Description: Manufacturer URL; ComponentLink1URL: http://www.weidmueller.com/; ComponentLink2Description: URL Link1; ComponentLink2URL: http://catalog.weidmueller.com/catalog/Start.do?localeId=en&ObjectID=1887490000
footprint LSF_SMT_3_5_135_08 (OMNIMATE Signal - Serie LSF  LSF-SMT 3.50/08/135 1.5)
pins: A1, A2, A3, A4, A5, A6, A7, A8
1 alternate drawing of the same symbol

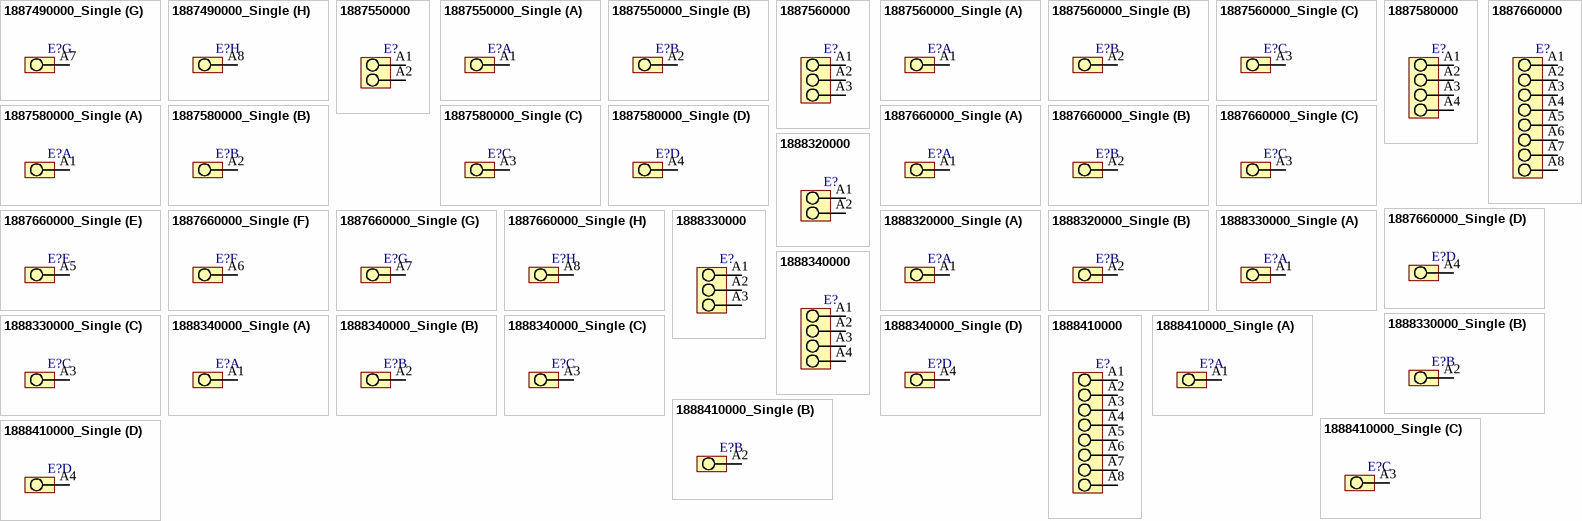
[diagram p180: symbols 1887490000_Single to 1888410000_Single]

## 1887490000_Single
designator E?
OMNIMATE Signal - series LSF; PartNumber: 1887490000; Manufacturer: Weidmueller; Short_text_for_material: LSF-SMT 3.50/08/135 3.5SN BK RL; Side_termination_characteristic: closed side; Mounting_onto_the_PCB: Reflow solder connection; Pitch_mm: 3,5 mm; Pitch_inch: 0,138 inch; No_of_poles: 8; Contact_material: Cu-Leg; Contact_surface: tinned; Insulating_material: LCP GF; UL_94_flammability_rating: V-0; Rated_voltage_for_surge_voltage_class_pollution_degree_II_2: 320 V; Rated_current_min_no_of_poles_TU_20_deg_C: 17,5 A; Solid_min_H05_07_V_U: 0,2 mm²; Solid_max_H05_07_V_U: 1,5 mm²; Rated_voltage_use_group_B_UL_1059: 300 V; Rated_current_use_group_B_UL_1059: 12 A; Wire_cross_section_AWG_min_UL_1059: AWG 24; Wire_cross_section_AWG_max_UL_1059: AWG 16; PackageReference: LSF_SMT_3_5_135_08; Colour: Black; Solder_pin_length_mm: 3,5 mm; Packaging: Tape; Qty: 190 PCS; Revision: V1; ComponentLink1Description: Manufacturer URL; ComponentLink1URL: http://www.weidmueller.com/; ComponentLink2Description: URL Link1; ComponentLink2URL: http://catalog.weidmueller.com/catalog/Start.do?localeId=en&ObjectID=1887490000
footprint LSF_SMT_3_5_135_08 (OMNIMATE Signal - Serie LSF  LSF-SMT 3.50/08/135 1.5)
part A pins: A1
part B pins: A2
part C pins: A3
part D pins: A4
part E pins: A5
part F pins: A6
part G pins: A7
part H pins: A8
1 alternate drawing of the same symbol